# Altium footprint library Inductors.PcbLib: 70 footprints (part 3 of 5)
Each footprint in its own frame and in the unit in brackets; x right, y up, seen from the top. Pads: shape width x height; smd on the part's side, far side on the other; paste and mask are expansions set on the pad; w line width, h text height; cw(c..) or ccw(c..) is an arc to the next point about the centre after c.
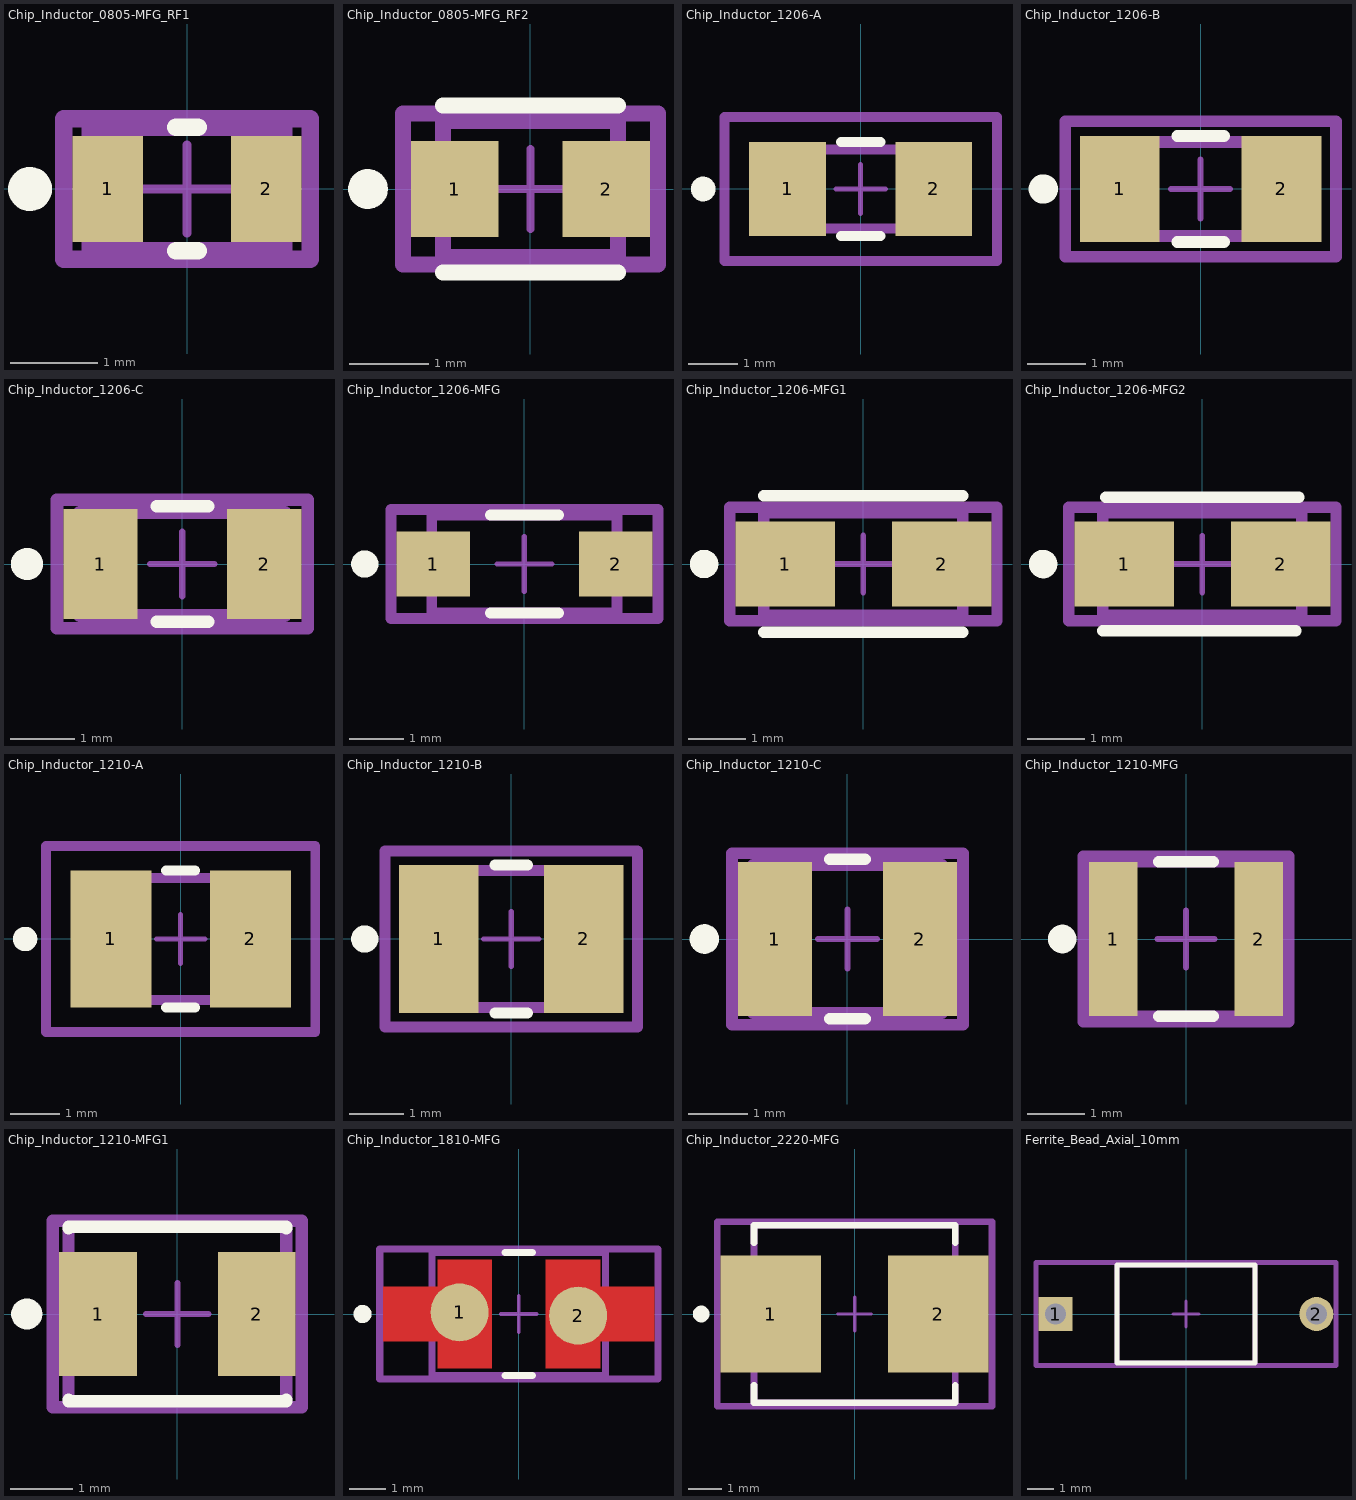
[diagram p2: the footprints below, top view; thin cyan lines are the x and y axes]

## Chip_Inductor_0805-MFG_RF1 [mm]
pads (2):
  rect 0.8x1.2 smd paste+0 mask+0: 1(-0.9,0) 2(0.9,0)
Top Overlay:
  circle w0.25: c-1.785,0 r0.125
  lines w0.2: -0.125,-0.7 0.125,-0.7 ; -0.125,0.7 0.125,0.7
Top Component Center:
  lines w0.1: -0.5,0 0.5,0 ; 0,-0.5 0,0.5
Top Assembly:
  lines w0.2: -1.4,-0.8 -1.4,0.8 1.4,0.8 1.4,-0.8 -1.4,-0.8
Top 3D Body:
  lines w0.2: -1.1,-0.7 -1.1,0.7 1.1,0.7 1.1,-0.7 -1.1,-0.7
Top Courtyard:
  lines w0.2: -1.4,-0.8 -1.4,0.8 1.4,0.8 1.4,-0.8 -1.4,-0.8
3D body "Ind_Murata_LQW21HN1R0J00L_eec.STEP": height 0.25, standoff 0, extent -1.4,-0.8 1.4,0.8

## Chip_Inductor_0805-MFG_RF2 [mm]
pads (2):
  rect 1.1x1.2 smd paste+0 mask+0: 1(-0.95,0) 2(0.95,0)
Top Overlay:
  circle w0.25: c-2.039,0 r0.125
  lines w0.2: -1.1,-1.05 1.1,-1.05 ; -1.1,1.05 1.1,1.05
Top Component Center:
  lines w0.1: -0.5,0 0.5,0 ; 0,-0.5 0,0.5
Top Assembly:
  lines w0.2: -1.6,-0.95 1.6,-0.95 1.6,0.95 -1.6,0.95 -1.6,-0.95
Top 3D Body:
  lines w0.2: -1.1,-0.85 1.1,-0.85 1.1,0.85 -1.1,0.85 -1.1,-0.85
Top Courtyard:
  lines w0.2: -1.6,-0.95 1.6,-0.95 1.6,0.95 -1.6,0.95 -1.6,-0.95
3D body "Ind_Murata_LQW2BHN10NJ03K_eec.STEP": height 0.25, standoff 0, extent -1.6,-0.95 1.6,0.95

## Chip_Inductor_1206-A [mm]
pads (2):
  rect 1.555x1.906 smd paste+0 mask+0: 1(-1.476,0) 2(1.476,0)
Top Overlay:
  circle w0.25: c-3.182,0 r0.125
  lines w0.2: -0.398,-0.953 0.398,-0.953 ; -0.398,0.953 0.398,0.953
Top Component Center:
  lines w0.1: -0.5,0 0.5,0 ; 0,-0.5 0,0.5
Top Assembly:
  lines w0.2: -2.753,-1.453 -2.753,1.453 2.753,1.453 2.753,-1.453 -2.753,-1.453
Top 3D Body:
  lines w0.2: -1.6,-0.8 -1.6,0.8 1.6,0.8 1.6,-0.8 -1.6,-0.8
Top Courtyard:
  lines w0.2: -2.753,-1.453 -2.753,1.453 2.753,1.453 2.753,-1.453 -2.753,-1.453
3D body "Ind_Murata_LQM31PN3R3M00L_eec.STEP": height 0.25, standoff 0, extent -2.753,-1.453 2.753,1.453

## Chip_Inductor_1206-B [mm]
pads (2):
  rect 1.355x1.806 smd paste+0 mask+0: 1(-1.376,0) 2(1.376,0)
Top Overlay:
  circle w0.25: c-2.674,0 r0.125
  lines w0.2: -0.398,-0.903 0.398,-0.903 ; -0.398,0.903 0.398,0.903
Top Component Center:
  lines w0.1: -0.5,0 0.5,0 ; 0,-0.5 0,0.5
Top Assembly:
  lines w0.2: -2.303,-1.153 2.303,-1.153 2.303,1.153 -2.303,1.153 -2.303,-1.153
Top 3D Body:
  lines w0.2: -1.6,-0.8 1.6,-0.8 1.6,0.8 -1.6,0.8 -1.6,-0.8
Top Courtyard:
  lines w0.2: -2.303,-1.153 2.303,-1.153 2.303,1.153 -2.303,1.153 -2.303,-1.153
3D body "Ind_Murata_LQM31PN3R3M00L_eec.STEP": height 0.25, standoff 0, extent -2.303,-1.153 2.303,1.153

## Chip_Inductor_1206-C [mm]
pads (2):
  rect 1.155x1.706 smd paste+0 mask+0: 1(-1.276,0) 2(1.276,0)
Top Overlay:
  circle w0.25: c-2.42,0 r0.125
  lines w0.2: -0.398,-0.9 0.398,-0.9 ; -0.398,0.9 0.398,0.9
Top Component Center:
  lines w0.1: -0.5,0 0.5,0 ; 0,-0.5 0,0.5
Top Assembly:
  lines w0.2: -1.953,-1 1.953,-1 1.953,1 -1.953,1 -1.953,-1
Top 3D Body:
  lines w0.2: -1.6,-0.8 1.6,-0.8 1.6,0.8 -1.6,0.8 -1.6,-0.8
Top Courtyard:
  lines w0.2: -1.953,-1 1.953,-1 1.953,1 -1.953,1 -1.953,-1
3D body "Ind_Murata_LQM31PN3R3M00L_eec.STEP": height 0.25, standoff 0, extent -1.953,-1 1.953,1

## Chip_Inductor_1206-MFG [mm]
pads (2):
  rect 1.35x1.2 smd paste+0 mask+0: 1(-1.675,0) 2(1.675,0)
Top Overlay:
  circle w0.25: c-2.928,0 r0.125
  lines w0.2: -0.625,-0.9 0.625,-0.9 ; -0.625,0.9 0.625,0.9
Top Component Center:
  lines w0.1: -0.5,0 0.5,0 ; 0,-0.5 0,0.5
Top Assembly:
  lines w0.2: -2.45,-1 2.45,-1 2.45,1 -2.45,1 -2.45,-1
Top 3D Body:
  lines w0.2: -1.7,-0.9 1.7,-0.9 1.7,0.9 -1.7,0.9 -1.7,-0.9
Top Courtyard:
  lines w0.2: -2.45,-1 2.45,-1 2.45,1 -2.45,1 -2.45,-1
3D body "Ind_Murata_LQM31PN3R3M00L_eec.STEP": height 0.25, standoff 0, extent -2.45,-1 2.45,1

## Chip_Inductor_1206-MFG1 [mm]
pads (2):
  rect 1.75x1.5 smd paste+0 mask+0: 1(-1.375,0) 2(1.375,0)
Top Overlay:
  circle w0.25: c-2.801,0 r0.125
  lines w0.2: -1.75,-1.2 1.75,-1.2 ; -1.75,1.2 1.75,1.2
Top Component Center:
  lines w0.1: -0.5,0 0.5,0 ; 0,-0.5 0,0.5
Top Assembly:
  lines w0.2: -2.35,-1 -2.35,1 2.35,1 2.35,-1 -2.35,-1
Top 3D Body:
  lines w0.2: -1.75,-0.9 -1.75,0.9 1.75,0.9 1.75,-0.9 -1.75,-0.9
Top Courtyard:
  lines w0.2: -2.35,-1 -2.35,1 2.35,1 2.35,-1 -2.35,-1
3D body "Ind_Murata_LQH31CN100K03K_eec.STEP": height 0.25, standoff 0, extent -2.35,-1 2.35,1

## Chip_Inductor_1206-MFG2 [mm]
pads (2):
  rect 1.75x1.5 smd paste+0 mask+0: 1(-1.375,0) 2(1.375,0)
Top Overlay:
  circle w0.25: c-2.801,0 r0.125
  lines w0.2: -1.753,-1.173 1.647,-1.173 ; -1.7,1.175 1.7,1.175
Top Component Center:
  lines w0.1: -0.5,0 0.5,0 ; 0,-0.5 0,0.5
Top Assembly:
  lines w0.2: -2.35,-1 -2.35,1 2.35,1 2.35,-1 -2.35,-1
Top 3D Body:
  lines w0.2: -1.75,-0.9 -1.75,0.9 1.75,0.9 1.75,-0.9 -1.75,-0.9
Top Courtyard:
  lines w0.2: -2.35,-1 -2.35,1 2.35,1 2.35,-1 -2.35,-1
3D body "Ind_Murata_LQW31HN15NJ03K_eec.STEP": height 0.25, standoff 0, extent -2.35,-1 2.35,1

## Chip_Inductor_1210-A [mm]
pads (2):
  rect 1.654x2.806 smd paste+0 mask+0: 1(-1.426,0) 2(1.426,0)
Top Overlay:
  circle w0.25: c-3.182,0 r0.125
  lines w0.2: -0.299,-1.403 0.299,-1.403 ; -0.299,1.403 0.299,1.403
Top Component Center:
  lines w0.1: -0.5,0 0.5,0 ; 0,-0.5 0,0.5
Top Assembly:
  lines w0.2: -2.753,-1.903 2.753,-1.903 2.753,1.903 -2.753,1.903 -2.753,-1.903
Top 3D Body:
  lines w0.2: -1.6,-1.25 1.6,-1.25 1.6,1.25 -1.6,1.25 -1.6,-1.25
Top Courtyard:
  lines w0.2: -2.753,-1.903 2.753,-1.903 2.753,1.903 -2.753,1.903 -2.753,-1.903
3D body "Ind_Taiyo_Yuden_CBC3225T2R2MR_eec.STEP": height 0.25, standoff 0, extent -2.753,-1.903 2.753,1.903

## Chip_Inductor_1210-B [mm]
pads (2):
  rect 1.454x2.706 smd paste+0 mask+0: 1(-1.326,0) 2(1.326,0)
Top Overlay:
  circle w0.25: c-2.674,0 r0.125
  lines w0.2: -0.299,-1.353 0.299,-1.353 ; -0.299,1.353 0.299,1.353
Top Component Center:
  lines w0.1: -0.5,0 0.5,0 ; 0,-0.5 0,0.5
Top Assembly:
  lines w0.2: -2.303,-1.603 2.303,-1.603 2.303,1.603 -2.303,1.603 -2.303,-1.603
Top 3D Body:
  lines w0.2: -1.6,-1.25 1.6,-1.25 1.6,1.25 -1.6,1.25 -1.6,-1.25
Top Courtyard:
  lines w0.2: -2.303,-1.603 2.303,-1.603 2.303,1.603 -2.303,1.603 -2.303,-1.603
3D body "Ind_Taiyo_Yuden_CBC3225T2R2MR_eec.STEP": height 0.25, standoff 0, extent -2.303,-1.603 2.303,1.603

## Chip_Inductor_1210-C [mm]
pads (2):
  rect 1.254x2.606 smd paste+0 mask+0: 1(-1.226,0) 2(1.226,0)
Top Overlay:
  circle w0.25: c-2.42,0 r0.125
  lines w0.2: -0.299,-1.35 0.299,-1.35 ; -0.299,1.35 0.299,1.35
Top Component Center:
  lines w0.1: -0.5,0 0.5,0 ; 0,-0.5 0,0.5
Top Assembly:
  lines w0.2: -1.953,-1.45 -1.953,1.45 1.953,1.45 1.953,-1.45 -1.953,-1.45
Top 3D Body:
  lines w0.2: -1.6,-1.25 -1.6,1.25 1.6,1.25 1.6,-1.25 -1.6,-1.25
Top Courtyard:
  lines w0.2: -1.953,-1.45 -1.953,1.45 1.953,1.45 1.953,-1.45 -1.953,-1.45
3D body "Ind_Taiyo_Yuden_CBC3225T2R2MR_eec.STEP": height 0.25, standoff 0, extent -1.953,-1.45 1.953,1.45

## Chip_Inductor_1210-MFG [mm]
pads (2):
  rect 0.85x2.7 smd paste+0 mask+0: 1(-1.275,0) 2(1.275,0)
Top Overlay:
  circle w0.25: c-2.166,0 r0.125
  lines w0.2: -0.475,-1.35 0.475,-1.35 ; -0.475,1.35 0.475,1.35
Top Component Center:
  lines w0.1: -0.5,0 0.5,0 ; 0,-0.5 0,0.5
Top Assembly:
  lines w0.2: -1.8,-1.45 1.8,-1.45 1.8,1.45 -1.8,1.45 -1.8,-1.45
Top 3D Body:
  lines w0.2: -1.7,-1.35 1.7,-1.35 1.7,1.35 -1.7,1.35 -1.7,-1.35
Top Courtyard:
  lines w0.2: -1.8,-1.45 1.8,-1.45 1.8,1.45 -1.8,1.45 -1.8,-1.45
3D body "Ind_Taiyo_Yuden_CBC3225T2R2MR_eec.STEP": height 0.25, standoff 0, extent -1.8,-1.45 1.8,1.45

## Chip_Inductor_1210-MFG1 [mm]
pads (2):
  rect 1.25x2 smd paste+0 mask+0: 1(-1.275,0) 2(1.275,0)
Top Overlay:
  circle w0.25: c-2.42,0 r0.125
  lines w0.2: -1.75,-1.375 -1.75,-1.4 1.75,-1.4 1.75,-1.375 ; -1.75,1.375 -1.75,1.4 1.75,1.4 1.75,1.375
Top Component Center:
  lines w0.1: -0.5,0 0.5,0 ; 0,-0.5 0,0.5
Top Assembly:
  lines w0.2: -2,-1.5 2,-1.5 2,1.5 -2,1.5 -2,-1.5
Top 3D Body:
  lines w0.2: -1.75,-1.4 1.75,-1.4 1.75,1.4 -1.75,1.4 -1.75,-1.4
Top Courtyard:
  lines w0.2: -2,-1.5 2,-1.5 2,1.5 -2,1.5 -2,-1.5
3D body "Ind_Murata_LQH32PN100MN0L_eec.STEP": height 0.25, standoff 0, extent -2,-1.5 2,1.5

## Chip_Inductor_1810-MFG [mm]
pads (2):
  round 1.603 smd paste+0 mask+0: 1(-1.641,0.047) 2(1.641,-0.047)
Top Layer:
  region: 3.75,0.75 2.25,0.75 2.25,1.5 0.75,1.5 0.75,-1.5 2.25,-1.5 2.25,-0.75 3.75,-0.75
  region: -3.75,0.75 -2.25,0.75 -2.25,1.5 -0.75,1.5 -0.75,-1.5 -2.25,-1.5 -2.25,-0.75 -3.75,-0.75
Top Overlay:
  circle w0.25: c-4.325,0 r0.125
  lines w0.2: -0.375,-1.7 0.375,-1.7 ; -0.375,1.7 0.375,1.7
Top Component Center:
  lines w0.1: -0.5,0 0.5,0 ; 0,-0.5 0,0.5
Top Assembly:
  lines w0.2: -3.85,-1.8 -3.85,1.8 3.85,1.8 3.85,-1.8 -3.85,-1.8
Top 3D Body:
  lines w0.2: -2.4,-1.7 -2.4,1.7 2.4,1.7 2.4,-1.7 -2.4,-1.7
Top Courtyard:
  lines w0.2: -3.85,-1.8 -3.85,1.8 3.85,1.8 3.85,-1.8 -3.85,-1.8
3D body "Ind_Murata_LQH43MN3R3M03L_eec.STEP": height 0.25, standoff 0, extent -3.85,-1.8 3.85,1.8

## Chip_Inductor_2220-MFG [mm]
pads (2):
  rect 3x3.5 smd paste+0 mask+0: 1(-2.5,0) 2(2.5,0)
Top Overlay:
  circle w0.25: c-4.579,0 r0.125
  lines w0.2: -3,-2.125 -3,-2.65 3,-2.65 3,-2.125 ; -3,2.125 -3,2.65 3,2.65 3,2.125
Top Component Center:
  lines w0.1: -0.5,0 0.5,0 ; 0,-0.5 0,0.5
Top Assembly:
  lines w0.2: -4.1,-2.75 4.1,-2.75 4.1,2.75 -4.1,2.75 -4.1,-2.75
Top 3D Body:
  lines w0.2: -3,-2.65 3,-2.65 3,2.65 -3,2.65 -3,-2.65
Top Courtyard:
  lines w0.2: -4.1,-2.75 4.1,-2.75 4.1,2.75 -4.1,2.75 -4.1,-2.75
3D body "Ind_Murata_LQH55DN150M03L_eec.STEP": height 0.25, standoff 0, extent -4.1,-2.75 4.1,2.75

## Ferrite_Bead_Axial_10mm [mm]
pads (2):
  rect 1.3x1.3 hole 0.8 paste-2539.97 mask+0: 1(-5,0)
  round 1.3 hole 0.8 paste-2539.97 mask+0: 2(5,0)
Top Overlay:
  lines w0.2: -2.65,-1.875 2.65,-1.875 2.65,1.875 -2.65,1.875 -2.65,-1.875
Top Component Center:
  lines w0.1: -0.5,0 0.5,0 ; 0,-0.5 0,0.5
Top Assembly:
  lines w0.2: -5.75,-1.975 5.75,-1.975 5.75,1.975 -5.75,1.975 -5.75,-1.975
Top 3D Body:
  lines w0.2: -2.65,-1.875 2.65,-1.875 2.65,1.875 -2.65,1.875 -2.65,-1.875
Top Courtyard:
  lines w0.2: -5.75,-1.975 5.75,-1.975 5.75,1.975 -5.75,1.975 -5.75,-1.975
3D body "FBead_Murata_BL01RN1A2A2B_eec.STEP": height 0.25, standoff 0, extent -5.75,-1.975 5.75,1.975